# Altium integrated library module.IntLib: 5 symbols
Pins are listed as number, name and electrical type; pins without a type are passive.

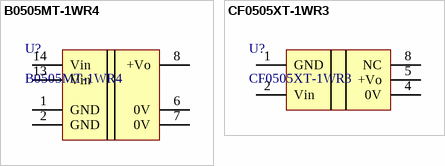
[diagram p0: symbols B0505MT-1WR4 to CF0505XT-1WR3]

## B0505MT-1WR4
designator U?
1W，定电压输入，隔离非稳压单路输出; Revised By: *; ComponentLink1Description: Datasheet; ComponentLink1URL: https://www.mornsun.cn/html/pdf/B0505MT-1WR4.html
footprint B-MT-1WR4
pins: 1 GND, 2 GND, 6 0V, 7 0V, 8 +Vo, 13 Vin, 14 Vin

## CF0505XT-1WR3
designator U?
1W，定电压输入，隔离非稳压单路输出; Revised By: Z_xiao; ComponentLink1Description: Datasheet; ComponentLink1URL: https://www.mornsun.cn/html/pdf/CF0505XT-1WR3.html
footprint F0505XT-W2R3
pins: 1 GND, 2 Vin, 4 0V, 5 +Vo, 8 NC


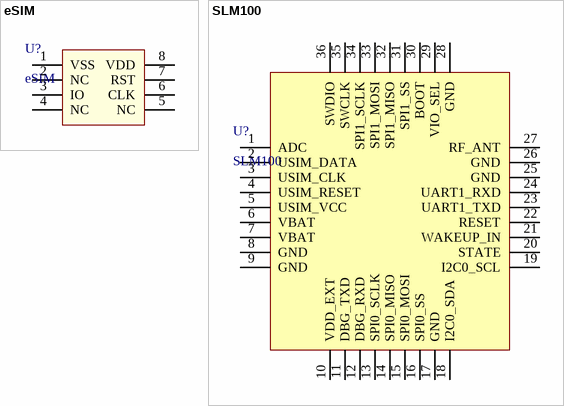
[diagram p1: symbols eSIM to SLM100]

## eSIM
designator U?
中移物联网eSIM 芯片
footprint WSON8_2X2
footprint WSON8_5X6
footprint WSON8_5X6-L
footprint WSON8_5X6-M
pins: 1 VSS, 2 NC, 3 IO, 4 NC, 5 NC, 6 CLK, 7 RST, 8 VDD

## SLM100
designator U?
SLM100 NB-IOT 模块
footprint SLM100
pins: 1 ADC, 2 USIM_DATA, 3 USIM_CLK, 4 USIM_RESET, 5 USIM_VCC, 6 VBAT, 7 VBAT, 8 GND, 9 GND, 10 VDD_EXT, 11 DBG_TXD, 12 DBG_RXD, 13 SPI0_SCLK, 14 SPI0_MISO, 15 SPI0_MOSI, 16 SPI0_SS, 17 GND, 18 I2C0_SDA, 19 I2C0_SCL, 20 STATE, 21 WAKEUP_IN, 22 RESET, 23 UART1_TXD, 24 UART1_RXD, 25 GND, 26 GND, 27 RF_ANT, 28 GND, 29 VIO_SEL, 30 BOOT, 31 SPI1_SS, 32 SPI1_MISO, 33 SPI1_MOSI, 34 SPI1_SCLK, 35 SWCLK, 36 SWDIO


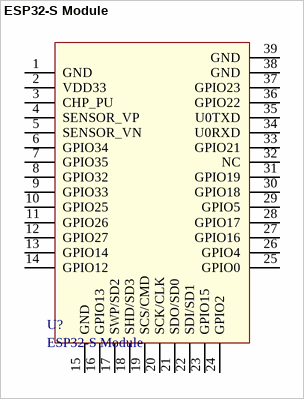
[diagram p2: symbol ESP32-S Module]

## ESP32-S Module
designator U?
通用型 WiFi-BT-BLE MCU 模组
footprint ESP32-S
pins: 1 GND, 2 VDD33, 3 CHP_PU, 4 SENSOR_VP, 5 SENSOR_VN, 6 GPIO34, 7 GPIO35, 8 GPIO32, 9 GPIO33, 10 GPIO25, 11 GPIO26, 12 GPIO27, 13 GPIO14, 14 GPIO12, 15 GND, 16 GPIO13, 17 SWP/SD2, 18 SHD/SD3, 19 SCS/CMD, 20 SCK/CLK, 21 SDO/SD0, 22 SDI/SD1, 23 GPIO15, 24 GPIO2, 25 GPIO0, 26 GPIO4, 27 GPIO16, 28 GPIO17, 29 GPIO5, 30 GPIO18, 31 GPIO19, 32 NC, 33 GPIO21, 34 U0RXD, 35 U0TXD, 36 GPIO22, 37 GPIO23, 38 GND, 39 GND